# Altium integrated library Samtec 2 mm Pitch Terminal Strips.IntLib: 623 symbols (part 1 of 5) (continued)
## MMT-104-01-F-DH-004
designator P?
Horizontal Surface Mount Header, -55 to 125 degC, 2 mm Pitch, 8-Pin, Male, RoHS; Manufacturer: Samtec; PartNumber: MMT-104-01-F-DH-004; Pitch: 2 mm; DatasheetVersion: F-214; PackageVersion: CY, 12/2000; PackageReference: MMT-104-01-X-DH-004; PackageDescription: 2mm Horizontal Terminal Surface Mount Strip ASSEM; Orientation: Horizontal; RoHS: True; Temperature Range: -55 to 125 degC; Mounting Technology: Surface Mount; ComponentLink1Description: Manufacturer URL; ComponentLink1URL: http://www.samtec.com; ComponentLink2Description: Datasheet; ComponentLink2URL: http://d2a072wq521u33.cloudfront.net/catalog_english//MMT_SM.PDF; ComponentLink3Description: Package Specification; ComponentLink3URL: http://www.samtec.com/documents/webfiles/cpdf/MMT-1XX-XX-XX-XX-XX-XXX-X-XX-MKT.pdf
footprint SMTC-MMT-104-01-X-DH-004 (Terminal Surface Mount Strip ASSEM, 2x4 Pins, Horizontal, 2mm Pitch, Male)
pins: 1, 2, 3, 4, 5, 6, 7, 8

## MMT-104-01-F-DH-A
designator P?
Horizontal Surface Mount Header, -55 to 125 degC, 2 mm Pitch, 8-Pin, Male, RoHS; Manufacturer: Samtec; PartNumber: MMT-104-01-F-DH-A; Pitch: 2 mm; DatasheetVersion: F-214; PackageVersion: CY, 12/2000; PackageReference: MMT-104-01-X-DH-A; PackageDescription: 2mm Horizontal Terminal Surface Mount Strip ASSEM; Orientation: Horizontal; RoHS: True; Temperature Range: -55 to 125 degC; Mounting Technology: Surface Mount; ComponentLink1Description: Manufacturer URL; ComponentLink1URL: http://www.samtec.com; ComponentLink2Description: Datasheet; ComponentLink2URL: http://d2a072wq521u33.cloudfront.net/catalog_english//MMT_SM.PDF; ComponentLink3Description: Package Specification; ComponentLink3URL: http://www.samtec.com/documents/webfiles/cpdf/MMT-1XX-XX-XX-XX-XX-XXX-X-XX-MKT.pdf
footprint SMTC-MMT-104-01-X-DH-A (Terminal Surface Mount Strip ASSEM, 2x4 Pins, Horizontal, 2mm Pitch, Male)
pins: 1, 2, 3, 4, 5, 6, 7, 8

## MMT-104-01-F-SH
designator P?
Horizontal Surface Mount Header, -55 to 125 degC, 2 mm Pitch, 4-Pin, Male, RoHS; Manufacturer: Samtec; PartNumber: MMT-104-01-F-SH; Pitch: 2 mm; DatasheetVersion: F-214; PackageVersion: CY, 12/2000; PackageReference: MMT-104-01-X-SH; PackageDescription: 2mm Horizontal Terminal Surface Mount Strip ASSEM; Orientation: Horizontal; RoHS: True; Temperature Range: -55 to 125 degC; Mounting Technology: Surface Mount; ComponentLink1Description: Manufacturer URL; ComponentLink1URL: http://www.samtec.com; ComponentLink2Description: Datasheet; ComponentLink2URL: http://d2a072wq521u33.cloudfront.net/catalog_english//MMT_SM.PDF; ComponentLink3Description: Package Specification; ComponentLink3URL: http://www.samtec.com/documents/webfiles/cpdf/MMT-1XX-XX-XX-XX-XX-XXX-X-XX-MKT.pdf
footprint SMTC-MMT-104-01-X-SH (Terminal Surface Mount Strip ASSEM, 1x4 Pins, Horizontal, 2mm Pitch, Male)
pins: 1, 2, 3, 4

## MMT-104-01-L-DH
designator P?
Horizontal Surface Mount Header, -55 to 125 degC, 2 mm Pitch, 8-Pin, Male, RoHS; Manufacturer: Samtec; PartNumber: MMT-104-01-L-DH; Pitch: 2 mm; DatasheetVersion: F-214; PackageVersion: CY, 12/2000; PackageReference: MMT-104-01-X-DH; PackageDescription: 2mm Horizontal Terminal Surface Mount Strip ASSEM; Supplier 1: Newark; Supplier Part Number 1: 85T5657; Orientation: Horizontal; RoHS: True; Temperature Range: -55 to 125 degC; Mounting Technology: Surface Mount; ComponentLink1Description: Manufacturer URL; ComponentLink1URL: http://www.samtec.com; ComponentLink2Description: Datasheet; ComponentLink2URL: http://d2a072wq521u33.cloudfront.net/catalog_english//MMT_SM.PDF; ComponentLink3Description: Package Specification; ComponentLink3URL: http://www.samtec.com/documents/webfiles/cpdf/MMT-1XX-XX-XX-XX-XX-XXX-X-XX-MKT.pdf
footprint SMTC-MMT-104-01-X-DH (Terminal Surface Mount Strip ASSEM, 2x4 Pins, Horizontal, 2mm Pitch, Male)
pins: 1, 2, 3, 4, 5, 6, 7, 8

## MMT-104-01-L-DH-004
designator P?
Horizontal Surface Mount Header, -55 to 125 degC, 2 mm Pitch, 8-Pin, Male, RoHS; Manufacturer: Samtec; PartNumber: MMT-104-01-L-DH-004; Pitch: 2 mm; DatasheetVersion: F-214; PackageVersion: CY, 12/2000; PackageReference: MMT-104-01-X-DH-004; PackageDescription: 2mm Horizontal Terminal Surface Mount Strip ASSEM; Orientation: Horizontal; RoHS: True; Temperature Range: -55 to 125 degC; Mounting Technology: Surface Mount; ComponentLink1Description: Manufacturer URL; ComponentLink1URL: http://www.samtec.com; ComponentLink2Description: Datasheet; ComponentLink2URL: http://d2a072wq521u33.cloudfront.net/catalog_english//MMT_SM.PDF; ComponentLink3Description: Package Specification; ComponentLink3URL: http://www.samtec.com/documents/webfiles/cpdf/MMT-1XX-XX-XX-XX-XX-XXX-X-XX-MKT.pdf
footprint SMTC-MMT-104-01-X-DH-004 (Terminal Surface Mount Strip ASSEM, 2x4 Pins, Horizontal, 2mm Pitch, Male)
pins: 1, 2, 3, 4, 5, 6, 7, 8

## MMT-104-01-L-DH-A
designator P?
Horizontal Surface Mount Header, -55 to 125 degC, 2 mm Pitch, 8-Pin, Male, RoHS; Manufacturer: Samtec; PartNumber: MMT-104-01-L-DH-A; Pitch: 2 mm; DatasheetVersion: F-214; PackageVersion: CY, 12/2000; PackageReference: MMT-104-01-X-DH-A; PackageDescription: 2mm Horizontal Terminal Surface Mount Strip ASSEM; Orientation: Horizontal; RoHS: True; Temperature Range: -55 to 125 degC; Mounting Technology: Surface Mount; ComponentLink1Description: Manufacturer URL; ComponentLink1URL: http://www.samtec.com; ComponentLink2Description: Datasheet; ComponentLink2URL: http://d2a072wq521u33.cloudfront.net/catalog_english//MMT_SM.PDF; ComponentLink3Description: Package Specification; ComponentLink3URL: http://www.samtec.com/documents/webfiles/cpdf/MMT-1XX-XX-XX-XX-XX-XXX-X-XX-MKT.pdf
footprint SMTC-MMT-104-01-X-DH-A (Terminal Surface Mount Strip ASSEM, 2x4 Pins, Horizontal, 2mm Pitch, Male)
pins: 1, 2, 3, 4, 5, 6, 7, 8

## MMT-104-01-L-SH
designator P?
Horizontal Surface Mount Header, -55 to 125 degC, 2 mm Pitch, 4-Pin, Male, RoHS; Manufacturer: Samtec; PartNumber: MMT-104-01-L-SH; Pitch: 2 mm; DatasheetVersion: F-214; PackageVersion: CY, 12/2000; PackageReference: MMT-104-01-X-SH; PackageDescription: 2mm Horizontal Terminal Surface Mount Strip ASSEM; Supplier 1: Newark; Supplier Part Number 1: 85T5659; Orientation: Horizontal; RoHS: True; Temperature Range: -55 to 125 degC; Mounting Technology: Surface Mount; ComponentLink1Description: Manufacturer URL; ComponentLink1URL: http://www.samtec.com; ComponentLink2Description: Datasheet; ComponentLink2URL: http://d2a072wq521u33.cloudfront.net/catalog_english//MMT_SM.PDF; ComponentLink3Description: Package Specification; ComponentLink3URL: http://www.samtec.com/documents/webfiles/cpdf/MMT-1XX-XX-XX-XX-XX-XXX-X-XX-MKT.pdf
footprint SMTC-MMT-104-01-X-SH (Terminal Surface Mount Strip ASSEM, 1x4 Pins, Horizontal, 2mm Pitch, Male)
pins: 1, 2, 3, 4

## MMT-104-01-T-DH
designator P?
Horizontal Surface Mount Header, -55 to 105 degC, 2 mm Pitch, 8-Pin, Male, RoHS; Manufacturer: Samtec; PartNumber: MMT-104-01-T-DH; Pitch: 2 mm; DatasheetVersion: F-214; PackageVersion: CY, 12/2000; PackageReference: MMT-104-01-X-DH; PackageDescription: 2mm Horizontal Terminal Surface Mount Strip ASSEM; Supplier 1: Newark; Supplier Part Number 1: 85T5660; Orientation: Horizontal; RoHS: True; Temperature Range: -55 to 105 degC; Mounting Technology: Surface Mount; ComponentLink1Description: Manufacturer URL; ComponentLink1URL: http://www.samtec.com; ComponentLink2Description: Datasheet; ComponentLink2URL: http://d2a072wq521u33.cloudfront.net/catalog_english//MMT_SM.PDF; ComponentLink3Description: Package Specification; ComponentLink3URL: http://www.samtec.com/documents/webfiles/cpdf/MMT-1XX-XX-XX-XX-XX-XXX-X-XX-MKT.pdf
footprint SMTC-MMT-104-01-X-DH (Terminal Surface Mount Strip ASSEM, 2x4 Pins, Horizontal, 2mm Pitch, Male)
pins: 1, 2, 3, 4, 5, 6, 7, 8

## MMT-104-01-T-DH-004
designator P?
Horizontal Surface Mount Header, -55 to 105 degC, 2 mm Pitch, 8-Pin, Male, RoHS; Manufacturer: Samtec; PartNumber: MMT-104-01-T-DH-004; Pitch: 2 mm; DatasheetVersion: F-214; PackageVersion: CY, 12/2000; PackageReference: MMT-104-01-X-DH-004; PackageDescription: 2mm Horizontal Terminal Surface Mount Strip ASSEM; Orientation: Horizontal; RoHS: True; Temperature Range: -55 to 105 degC; Mounting Technology: Surface Mount; ComponentLink1Description: Manufacturer URL; ComponentLink1URL: http://www.samtec.com; ComponentLink2Description: Datasheet; ComponentLink2URL: http://d2a072wq521u33.cloudfront.net/catalog_english//MMT_SM.PDF; ComponentLink3Description: Package Specification; ComponentLink3URL: http://www.samtec.com/documents/webfiles/cpdf/MMT-1XX-XX-XX-XX-XX-XXX-X-XX-MKT.pdf
footprint SMTC-MMT-104-01-X-DH-004 (Terminal Surface Mount Strip ASSEM, 2x4 Pins, Horizontal, 2mm Pitch, Male)
pins: 1, 2, 3, 4, 5, 6, 7, 8

## MMT-104-01-T-DH-A
designator P?
Horizontal Surface Mount Header, -55 to 105 degC, 2 mm Pitch, 8-Pin, Male, RoHS; Manufacturer: Samtec; PartNumber: MMT-104-01-T-DH-A; Pitch: 2 mm; DatasheetVersion: F-214; PackageVersion: CY, 12/2000; PackageReference: MMT-104-01-X-DH-A; PackageDescription: 2mm Horizontal Terminal Surface Mount Strip ASSEM; Orientation: Horizontal; RoHS: True; Temperature Range: -55 to 105 degC; Mounting Technology: Surface Mount; ComponentLink1Description: Manufacturer URL; ComponentLink1URL: http://www.samtec.com; ComponentLink2Description: Datasheet; ComponentLink2URL: http://d2a072wq521u33.cloudfront.net/catalog_english//MMT_SM.PDF; ComponentLink3Description: Package Specification; ComponentLink3URL: http://www.samtec.com/documents/webfiles/cpdf/MMT-1XX-XX-XX-XX-XX-XXX-X-XX-MKT.pdf
footprint SMTC-MMT-104-01-X-DH-A (Terminal Surface Mount Strip ASSEM, 2x4 Pins, Horizontal, 2mm Pitch, Male)
pins: 1, 2, 3, 4, 5, 6, 7, 8

## MMT-104-01-T-SH
designator P?
Horizontal Surface Mount Header, -55 to 105 degC, 2 mm Pitch, 4-Pin, Male, RoHS; Manufacturer: Samtec; PartNumber: MMT-104-01-T-SH; Pitch: 2 mm; DatasheetVersion: F-214; PackageVersion: CY, 12/2000; PackageReference: MMT-104-01-X-SH; PackageDescription: 2mm Horizontal Terminal Surface Mount Strip ASSEM; Supplier 1: Digi-Key; Supplier Part Number 1: MMT-104-01-T-SH-ND; Supplier 2: Newark; Supplier Part Number 2: 85T5662; Orientation: Horizontal; RoHS: True; Temperature Range: -55 to 105 degC; Mounting Technology: Surface Mount; ComponentLink1Description: Manufacturer URL; ComponentLink1URL: http://www.samtec.com; ComponentLink2Description: Datasheet; ComponentLink2URL: http://d2a072wq521u33.cloudfront.net/catalog_english//MMT_SM.PDF; ComponentLink3Description: Package Specification; ComponentLink3URL: http://www.samtec.com/documents/webfiles/cpdf/MMT-1XX-XX-XX-XX-XX-XXX-X-XX-MKT.pdf
footprint SMTC-MMT-104-01-X-SH (Terminal Surface Mount Strip ASSEM, 1x4 Pins, Horizontal, 2mm Pitch, Male)
pins: 1, 2, 3, 4

## MMT-104-02-F-DH
designator P?
Horizontal Surface Mount Header, -55 to 125 degC, 2 mm Pitch, 8-Pin, Male, RoHS; Manufacturer: Samtec; PartNumber: MMT-104-02-F-DH; Pitch: 2 mm; DatasheetVersion: F-214; PackageVersion: CY, 12/2000; PackageReference: MMT-104-02-X-DH; PackageDescription: 2mm Horizontal Terminal Surface Mount Strip ASSEM; Orientation: Horizontal; RoHS: True; Temperature Range: -55 to 125 degC; Mounting Technology: Surface Mount; ComponentLink1Description: Manufacturer URL; ComponentLink1URL: http://www.samtec.com; ComponentLink2Description: Datasheet; ComponentLink2URL: http://d2a072wq521u33.cloudfront.net/catalog_english//MMT_SM.PDF; ComponentLink3Description: Package Specification; ComponentLink3URL: http://www.samtec.com/documents/webfiles/cpdf/MMT-1XX-XX-XX-XX-XX-XXX-X-XX-MKT.pdf
footprint SMTC-MMT-104-02-X-DH (Terminal Surface Mount Strip ASSEM, 2x4 Pins, Horizontal, 2mm Pitch, Male)
pins: 1, 2, 3, 4, 5, 6, 7, 8

## MMT-104-02-F-MT-P
designator P?
Header, Horizontal, -55 to 125 degC, 2 mm Pitch, 8-Pin, Male, RoHS; Manufacturer: Samtec; PartNumber: MMT-104-02-F-MT-P; Pitch: 2 mm; DatasheetVersion: F-214; PackageVersion: CY, 12/2000; PackageReference: MMT-104-02-X-MT-P; PackageDescription: 2mm Horizontal Terminal Surface Mount Strip ASSEM; Orientation: Horizontal; RoHS: True; Temperature Range: -55 to 125 degC; ComponentLink1Description: Manufacturer URL; ComponentLink1URL: http://www.samtec.com; ComponentLink2Description: Datasheet; ComponentLink2URL: http://d2a072wq521u33.cloudfront.net/catalog_english//MMT_SM.PDF; ComponentLink3Description: Package Specification; ComponentLink3URL: http://www.samtec.com/documents/webfiles/cpdf/MMT-1XX-XX-XX-XX-XX-XXX-X-XX-MKT.pdf
footprint SMTC-MMT-104-02-X-MT-P (Terminal Strip ASSEM, 2x4 Pins, Horizontal, 2mm Pitch, Male)
pins: 1, 2, 3, 4, 5, 6, 7, 8

## MMT-104-02-F-SH
designator P?
Horizontal Surface Mount Header, -55 to 125 degC, 2 mm Pitch, 4-Pin, Male, RoHS; Manufacturer: Samtec; PartNumber: MMT-104-02-F-SH; Pitch: 2 mm; DatasheetVersion: F-214; PackageVersion: CY, 12/2000; PackageReference: MMT-104-02-X-SH; PackageDescription: 2mm Horizontal Terminal Surface Mount Strip ASSEM; Orientation: Horizontal; RoHS: True; Temperature Range: -55 to 125 degC; Mounting Technology: Surface Mount; ComponentLink1Description: Manufacturer URL; ComponentLink1URL: http://www.samtec.com; ComponentLink2Description: Datasheet; ComponentLink2URL: http://d2a072wq521u33.cloudfront.net/catalog_english//MMT_SM.PDF; ComponentLink3Description: Package Specification; ComponentLink3URL: http://www.samtec.com/documents/webfiles/cpdf/MMT-1XX-XX-XX-XX-XX-XXX-X-XX-MKT.pdf
footprint SMTC-MMT-104-02-X-SH (Terminal Surface Mount Strip ASSEM, 1x4 Pins, Horizontal, 2mm Pitch, Male)
pins: 1, 2, 3, 4

## MMT-104-02-F-SH-P
designator P?
Horizontal Surface Mount Header, -55 to 125 degC, 2 mm Pitch, 4-Pin, Male, RoHS; Manufacturer: Samtec; PartNumber: MMT-104-02-F-SH-P; Pitch: 2 mm; DatasheetVersion: F-214; PackageVersion: CY, 12/2000; PackageReference: MMT-104-02-X-SH-P; PackageDescription: 2mm Horizontal Terminal Surface Mount Strip ASSEM; Orientation: Horizontal; RoHS: True; Temperature Range: -55 to 125 degC; Mounting Technology: Surface Mount; ComponentLink1Description: Manufacturer URL; ComponentLink1URL: http://www.samtec.com; ComponentLink2Description: Datasheet; ComponentLink2URL: http://d2a072wq521u33.cloudfront.net/catalog_english//MMT_SM.PDF; ComponentLink3Description: Package Specification; ComponentLink3URL: http://www.samtec.com/documents/webfiles/cpdf/MMT-1XX-XX-XX-XX-XX-XXX-X-XX-MKT.pdf
footprint SMTC-MMT-104-02-X-SH-P (Terminal Surface Mount Strip ASSEM, 1x4 Pins, Horizontal, 2mm Pitch, Male)
pins: 1, 2, 3, 4

## MMT-104-02-L-DH
designator P?
Horizontal Surface Mount Header, -55 to 125 degC, 2 mm Pitch, 8-Pin, Male, RoHS; Manufacturer: Samtec; PartNumber: MMT-104-02-L-DH; Pitch: 2 mm; DatasheetVersion: F-214; PackageVersion: CY, 12/2000; PackageReference: MMT-104-02-X-DH; PackageDescription: 2mm Horizontal Terminal Surface Mount Strip ASSEM; Supplier 1: Newark; Supplier Part Number 1: 85T5663; Orientation: Horizontal; RoHS: True; Temperature Range: -55 to 125 degC; Mounting Technology: Surface Mount; ComponentLink1Description: Manufacturer URL; ComponentLink1URL: http://www.samtec.com; ComponentLink2Description: Datasheet; ComponentLink2URL: http://d2a072wq521u33.cloudfront.net/catalog_english//MMT_SM.PDF; ComponentLink3Description: Package Specification; ComponentLink3URL: http://www.samtec.com/documents/webfiles/cpdf/MMT-1XX-XX-XX-XX-XX-XXX-X-XX-MKT.pdf
footprint SMTC-MMT-104-02-X-DH (Terminal Surface Mount Strip ASSEM, 2x4 Pins, Horizontal, 2mm Pitch, Male)
pins: 1, 2, 3, 4, 5, 6, 7, 8

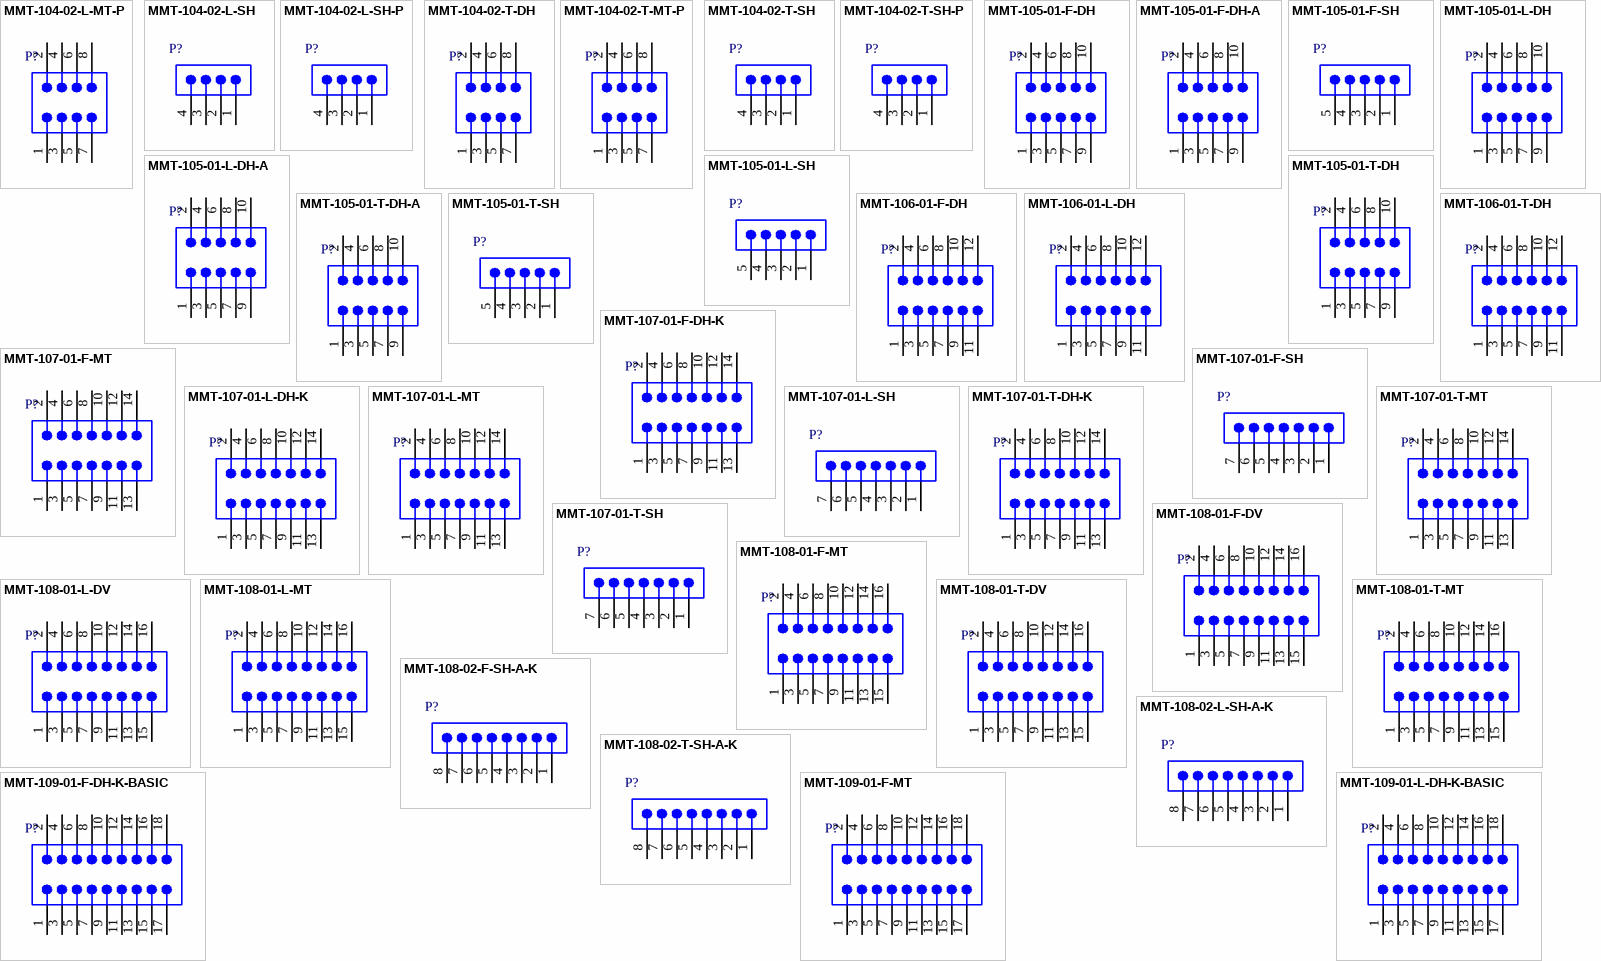
[diagram p2: symbols MMT-104-02-L-MT-P to MMT-109-01-L-DH-K-BASIC]

## MMT-104-02-L-MT-P
designator P?
Header, Horizontal, -55 to 125 degC, 2 mm Pitch, 8-Pin, Male, RoHS; Manufacturer: Samtec; PartNumber: MMT-104-02-L-MT-P; Pitch: 2 mm; DatasheetVersion: F-214; PackageVersion: CY, 12/2000; PackageReference: MMT-104-02-X-MT-P; PackageDescription: 2mm Horizontal Terminal Surface Mount Strip ASSEM; Orientation: Horizontal; RoHS: True; Temperature Range: -55 to 125 degC; ComponentLink1Description: Manufacturer URL; ComponentLink1URL: http://www.samtec.com; ComponentLink2Description: Datasheet; ComponentLink2URL: http://d2a072wq521u33.cloudfront.net/catalog_english//MMT_SM.PDF; ComponentLink3Description: Package Specification; ComponentLink3URL: http://www.samtec.com/documents/webfiles/cpdf/MMT-1XX-XX-XX-XX-XX-XXX-X-XX-MKT.pdf
footprint SMTC-MMT-104-02-X-MT-P (Terminal Strip ASSEM, 2x4 Pins, Horizontal, 2mm Pitch, Male)
pins: 1, 2, 3, 4, 5, 6, 7, 8

## MMT-104-02-L-SH
designator P?
Horizontal Surface Mount Header, -55 to 125 degC, 2 mm Pitch, 4-Pin, Male, RoHS; Manufacturer: Samtec; PartNumber: MMT-104-02-L-SH; Pitch: 2 mm; DatasheetVersion: F-214; PackageVersion: CY, 12/2000; PackageReference: MMT-104-02-X-SH; PackageDescription: 2mm Horizontal Terminal Surface Mount Strip ASSEM; Supplier 1: Newark; Supplier Part Number 1: 85T5665; Orientation: Horizontal; RoHS: True; Temperature Range: -55 to 125 degC; Mounting Technology: Surface Mount; ComponentLink1Description: Manufacturer URL; ComponentLink1URL: http://www.samtec.com; ComponentLink2Description: Datasheet; ComponentLink2URL: http://d2a072wq521u33.cloudfront.net/catalog_english//MMT_SM.PDF; ComponentLink3Description: Package Specification; ComponentLink3URL: http://www.samtec.com/documents/webfiles/cpdf/MMT-1XX-XX-XX-XX-XX-XXX-X-XX-MKT.pdf
footprint SMTC-MMT-104-02-X-SH (Terminal Surface Mount Strip ASSEM, 1x4 Pins, Horizontal, 2mm Pitch, Male)
pins: 1, 2, 3, 4

## MMT-104-02-L-SH-P
designator P?
Horizontal Surface Mount Header, -55 to 125 degC, 2 mm Pitch, 4-Pin, Male, RoHS; Manufacturer: Samtec; PartNumber: MMT-104-02-L-SH-P; Pitch: 2 mm; DatasheetVersion: F-214; PackageVersion: CY, 12/2000; PackageReference: MMT-104-02-X-SH-P; PackageDescription: 2mm Horizontal Terminal Surface Mount Strip ASSEM; Orientation: Horizontal; RoHS: True; Temperature Range: -55 to 125 degC; Mounting Technology: Surface Mount; ComponentLink1Description: Manufacturer URL; ComponentLink1URL: http://www.samtec.com; ComponentLink2Description: Datasheet; ComponentLink2URL: http://d2a072wq521u33.cloudfront.net/catalog_english//MMT_SM.PDF; ComponentLink3Description: Package Specification; ComponentLink3URL: http://www.samtec.com/documents/webfiles/cpdf/MMT-1XX-XX-XX-XX-XX-XXX-X-XX-MKT.pdf
footprint SMTC-MMT-104-02-X-SH-P (Terminal Surface Mount Strip ASSEM, 1x4 Pins, Horizontal, 2mm Pitch, Male)
pins: 1, 2, 3, 4

## MMT-104-02-T-DH
designator P?
Horizontal Surface Mount Header, -55 to 105 degC, 2 mm Pitch, 8-Pin, Male, RoHS; Manufacturer: Samtec; PartNumber: MMT-104-02-T-DH; Pitch: 2 mm; DatasheetVersion: F-214; PackageVersion: CY, 12/2000; PackageReference: MMT-104-02-X-DH; PackageDescription: 2mm Horizontal Terminal Surface Mount Strip ASSEM; Supplier 1: Newark; Supplier Part Number 1: 85T5666; Orientation: Horizontal; RoHS: True; Temperature Range: -55 to 105 degC; Mounting Technology: Surface Mount; ComponentLink1Description: Manufacturer URL; ComponentLink1URL: http://www.samtec.com; ComponentLink2Description: Datasheet; ComponentLink2URL: http://d2a072wq521u33.cloudfront.net/catalog_english//MMT_SM.PDF; ComponentLink3Description: Package Specification; ComponentLink3URL: http://www.samtec.com/documents/webfiles/cpdf/MMT-1XX-XX-XX-XX-XX-XXX-X-XX-MKT.pdf
footprint SMTC-MMT-104-02-X-DH (Terminal Surface Mount Strip ASSEM, 2x4 Pins, Horizontal, 2mm Pitch, Male)
pins: 1, 2, 3, 4, 5, 6, 7, 8

## MMT-104-02-T-MT-P
designator P?
Header, Horizontal, -55 to 105 degC, 2 mm Pitch, 8-Pin, Male, RoHS; Manufacturer: Samtec; PartNumber: MMT-104-02-T-MT-P; Pitch: 2 mm; DatasheetVersion: F-214; PackageVersion: CY, 12/2000; PackageReference: MMT-104-02-X-MT-P; PackageDescription: 2mm Horizontal Terminal Surface Mount Strip ASSEM; Orientation: Horizontal; RoHS: True; Temperature Range: -55 to 105 degC; ComponentLink1Description: Manufacturer URL; ComponentLink1URL: http://www.samtec.com; ComponentLink2Description: Datasheet; ComponentLink2URL: http://d2a072wq521u33.cloudfront.net/catalog_english//MMT_SM.PDF; ComponentLink3Description: Package Specification; ComponentLink3URL: http://www.samtec.com/documents/webfiles/cpdf/MMT-1XX-XX-XX-XX-XX-XXX-X-XX-MKT.pdf
footprint SMTC-MMT-104-02-X-MT-P (Terminal Strip ASSEM, 2x4 Pins, Horizontal, 2mm Pitch, Male)
pins: 1, 2, 3, 4, 5, 6, 7, 8

## MMT-104-02-T-SH
designator P?
Horizontal Surface Mount Header, -55 to 105 degC, 2 mm Pitch, 4-Pin, Male, RoHS; Manufacturer: Samtec; PartNumber: MMT-104-02-T-SH; Pitch: 2 mm; DatasheetVersion: F-214; PackageVersion: CY, 12/2000; PackageReference: MMT-104-02-X-SH; PackageDescription: 2mm Horizontal Terminal Surface Mount Strip ASSEM; Supplier 1: Digi-Key; Supplier Part Number 1: MMT-104-02-T-SH-ND; Supplier 2: Newark; Supplier Part Number 2: 85T5668; Orientation: Horizontal; RoHS: True; Temperature Range: -55 to 105 degC; Mounting Technology: Surface Mount; ComponentLink1Description: Manufacturer URL; ComponentLink1URL: http://www.samtec.com; ComponentLink2Description: Datasheet; ComponentLink2URL: http://d2a072wq521u33.cloudfront.net/catalog_english//MMT_SM.PDF; ComponentLink3Description: Package Specification; ComponentLink3URL: http://www.samtec.com/documents/webfiles/cpdf/MMT-1XX-XX-XX-XX-XX-XXX-X-XX-MKT.pdf
footprint SMTC-MMT-104-02-X-SH (Terminal Surface Mount Strip ASSEM, 1x4 Pins, Horizontal, 2mm Pitch, Male)
pins: 1, 2, 3, 4

## MMT-104-02-T-SH-P
designator P?
Horizontal Surface Mount Header, -55 to 105 degC, 2 mm Pitch, 4-Pin, Male, RoHS; Manufacturer: Samtec; PartNumber: MMT-104-02-T-SH-P; Pitch: 2 mm; DatasheetVersion: F-214; PackageVersion: CY, 12/2000; PackageReference: MMT-104-02-X-SH-P; PackageDescription: 2mm Horizontal Terminal Surface Mount Strip ASSEM; Orientation: Horizontal; RoHS: True; Temperature Range: -55 to 105 degC; Mounting Technology: Surface Mount; ComponentLink1Description: Manufacturer URL; ComponentLink1URL: http://www.samtec.com; ComponentLink2Description: Datasheet; ComponentLink2URL: http://d2a072wq521u33.cloudfront.net/catalog_english//MMT_SM.PDF; ComponentLink3Description: Package Specification; ComponentLink3URL: http://www.samtec.com/documents/webfiles/cpdf/MMT-1XX-XX-XX-XX-XX-XXX-X-XX-MKT.pdf
footprint SMTC-MMT-104-02-X-SH-P (Terminal Surface Mount Strip ASSEM, 1x4 Pins, Horizontal, 2mm Pitch, Male)
pins: 1, 2, 3, 4

## MMT-105-01-F-DH
designator P?
Horizontal Surface Mount Header, -55 to 125 degC, 2 mm Pitch, 10-Pin, Male, RoHS; Manufacturer: Samtec; PartNumber: MMT-105-01-F-DH; Pitch: 2 mm; DatasheetVersion: F-214; PackageVersion: CY, 12/2000; PackageReference: MMT-105-01-X-DH; PackageDescription: 2mm Horizontal Terminal Surface Mount Strip ASSEM; Orientation: Horizontal; RoHS: True; Temperature Range: -55 to 125 degC; Mounting Technology: Surface Mount; ComponentLink1Description: Manufacturer URL; ComponentLink1URL: http://www.samtec.com; ComponentLink2Description: Datasheet; ComponentLink2URL: http://d2a072wq521u33.cloudfront.net/catalog_english//MMT_SM.PDF; ComponentLink3Description: Package Specification; ComponentLink3URL: http://www.samtec.com/documents/webfiles/cpdf/MMT-1XX-XX-XX-XX-XX-XXX-X-XX-MKT.pdf
footprint SMTC-MMT-105-01-X-DH (Terminal Surface Mount Strip ASSEM, 2x5 Pins, Horizontal, 2mm Pitch, Male)
pins: 1, 2, 3, 4, 5, 6, 7, 8, 9, 10

## MMT-105-01-F-DH-A
designator P?
Horizontal Surface Mount Header, -55 to 125 degC, 2 mm Pitch, 10-Pin, Male, RoHS; Manufacturer: Samtec; PartNumber: MMT-105-01-F-DH-A; Pitch: 2 mm; DatasheetVersion: F-214; PackageVersion: CY, 12/2000; PackageReference: MMT-105-01-X-DH-A; PackageDescription: 2mm Horizontal Terminal Surface Mount Strip ASSEM; Orientation: Horizontal; RoHS: True; Temperature Range: -55 to 125 degC; Mounting Technology: Surface Mount; ComponentLink1Description: Manufacturer URL; ComponentLink1URL: http://www.samtec.com; ComponentLink2Description: Datasheet; ComponentLink2URL: http://d2a072wq521u33.cloudfront.net/catalog_english//MMT_SM.PDF; ComponentLink3Description: Package Specification; ComponentLink3URL: http://www.samtec.com/documents/webfiles/cpdf/MMT-1XX-XX-XX-XX-XX-XXX-X-XX-MKT.pdf
footprint SMTC-MMT-105-01-X-DH-A (Terminal Surface Mount Strip ASSEM, 2x5 Pins, Horizontal, 2mm Pitch, Male)
pins: 1, 2, 3, 4, 5, 6, 7, 8, 9, 10

## MMT-105-01-F-SH
designator P?
Horizontal Surface Mount Header, -55 to 125 degC, 2 mm Pitch, 5-Pin, Male, RoHS; Manufacturer: Samtec; PartNumber: MMT-105-01-F-SH; Pitch: 2 mm; DatasheetVersion: F-214; PackageVersion: CY, 12/2000; PackageReference: MMT-105-01-X-SH; PackageDescription: 2mm Horizontal Terminal Surface Mount Strip ASSEM; Orientation: Horizontal; RoHS: True; Temperature Range: -55 to 125 degC; Mounting Technology: Surface Mount; ComponentLink1Description: Manufacturer URL; ComponentLink1URL: http://www.samtec.com; ComponentLink2Description: Datasheet; ComponentLink2URL: http://d2a072wq521u33.cloudfront.net/catalog_english//MMT_SM.PDF; ComponentLink3Description: Package Specification; ComponentLink3URL: http://www.samtec.com/documents/webfiles/cpdf/MMT-1XX-XX-XX-XX-XX-XXX-X-XX-MKT.pdf
footprint SMTC-MMT-105-01-X-SH (Terminal Surface Mount Strip ASSEM, 1x5 Pins, Horizontal, 2mm Pitch, Male)
pins: 1, 2, 3, 4, 5

## MMT-105-01-L-DH
designator P?
Horizontal Surface Mount Header, -55 to 125 degC, 2 mm Pitch, 10-Pin, Male, RoHS; Manufacturer: Samtec; PartNumber: MMT-105-01-L-DH; Pitch: 2 mm; DatasheetVersion: F-214; PackageVersion: CY, 12/2000; PackageReference: MMT-105-01-X-DH; PackageDescription: 2mm Horizontal Terminal Surface Mount Strip ASSEM; Supplier 1: Newark; Supplier Part Number 1: 85T5669; Orientation: Horizontal; RoHS: True; Temperature Range: -55 to 125 degC; Mounting Technology: Surface Mount; ComponentLink1Description: Manufacturer URL; ComponentLink1URL: http://www.samtec.com; ComponentLink2Description: Datasheet; ComponentLink2URL: http://d2a072wq521u33.cloudfront.net/catalog_english//MMT_SM.PDF; ComponentLink3Description: Package Specification; ComponentLink3URL: http://www.samtec.com/documents/webfiles/cpdf/MMT-1XX-XX-XX-XX-XX-XXX-X-XX-MKT.pdf
footprint SMTC-MMT-105-01-X-DH (Terminal Surface Mount Strip ASSEM, 2x5 Pins, Horizontal, 2mm Pitch, Male)
pins: 1, 2, 3, 4, 5, 6, 7, 8, 9, 10

## MMT-105-01-L-DH-A
designator P?
Horizontal Surface Mount Header, -55 to 125 degC, 2 mm Pitch, 10-Pin, Male, RoHS; Manufacturer: Samtec; PartNumber: MMT-105-01-L-DH-A; Pitch: 2 mm; DatasheetVersion: F-214; PackageVersion: CY, 12/2000; PackageReference: MMT-105-01-X-DH-A; PackageDescription: 2mm Horizontal Terminal Surface Mount Strip ASSEM; Orientation: Horizontal; RoHS: True; Temperature Range: -55 to 125 degC; Mounting Technology: Surface Mount; ComponentLink1Description: Manufacturer URL; ComponentLink1URL: http://www.samtec.com; ComponentLink2Description: Datasheet; ComponentLink2URL: http://d2a072wq521u33.cloudfront.net/catalog_english//MMT_SM.PDF; ComponentLink3Description: Package Specification; ComponentLink3URL: http://www.samtec.com/documents/webfiles/cpdf/MMT-1XX-XX-XX-XX-XX-XXX-X-XX-MKT.pdf
footprint SMTC-MMT-105-01-X-DH-A (Terminal Surface Mount Strip ASSEM, 2x5 Pins, Horizontal, 2mm Pitch, Male)
pins: 1, 2, 3, 4, 5, 6, 7, 8, 9, 10

## MMT-105-01-L-SH
designator P?
Horizontal Surface Mount Header, -55 to 125 degC, 2 mm Pitch, 5-Pin, Male, RoHS; Manufacturer: Samtec; PartNumber: MMT-105-01-L-SH; Pitch: 2 mm; DatasheetVersion: F-214; PackageVersion: CY, 12/2000; PackageReference: MMT-105-01-X-SH; PackageDescription: 2mm Horizontal Terminal Surface Mount Strip ASSEM; Supplier 1: Newark; Supplier Part Number 1: 85T5672; Orientation: Horizontal; RoHS: True; Temperature Range: -55 to 125 degC; Mounting Technology: Surface Mount; ComponentLink1Description: Manufacturer URL; ComponentLink1URL: http://www.samtec.com; ComponentLink2Description: Datasheet; ComponentLink2URL: http://d2a072wq521u33.cloudfront.net/catalog_english//MMT_SM.PDF; ComponentLink3Description: Package Specification; ComponentLink3URL: http://www.samtec.com/documents/webfiles/cpdf/MMT-1XX-XX-XX-XX-XX-XXX-X-XX-MKT.pdf
footprint SMTC-MMT-105-01-X-SH (Terminal Surface Mount Strip ASSEM, 1x5 Pins, Horizontal, 2mm Pitch, Male)
pins: 1, 2, 3, 4, 5

## MMT-105-01-T-DH
designator P?
Horizontal Surface Mount Header, -55 to 105 degC, 2 mm Pitch, 10-Pin, Male, RoHS; Manufacturer: Samtec; PartNumber: MMT-105-01-T-DH; Pitch: 2 mm; DatasheetVersion: F-214; PackageVersion: CY, 12/2000; PackageReference: MMT-105-01-X-DH; PackageDescription: 2mm Horizontal Terminal Surface Mount Strip ASSEM; Supplier 1: Newark; Supplier Part Number 1: 85T5673; Orientation: Horizontal; RoHS: True; Temperature Range: -55 to 105 degC; Mounting Technology: Surface Mount; ComponentLink1Description: Manufacturer URL; ComponentLink1URL: http://www.samtec.com; ComponentLink2Description: Datasheet; ComponentLink2URL: http://d2a072wq521u33.cloudfront.net/catalog_english//MMT_SM.PDF; ComponentLink3Description: Package Specification; ComponentLink3URL: http://www.samtec.com/documents/webfiles/cpdf/MMT-1XX-XX-XX-XX-XX-XXX-X-XX-MKT.pdf
footprint SMTC-MMT-105-01-X-DH (Terminal Surface Mount Strip ASSEM, 2x5 Pins, Horizontal, 2mm Pitch, Male)
pins: 1, 2, 3, 4, 5, 6, 7, 8, 9, 10

## MMT-105-01-T-DH-A
designator P?
Horizontal Surface Mount Header, -55 to 105 degC, 2 mm Pitch, 10-Pin, Male, RoHS; Manufacturer: Samtec; PartNumber: MMT-105-01-T-DH-A; Pitch: 2 mm; DatasheetVersion: F-214; PackageVersion: CY, 12/2000; PackageReference: MMT-105-01-X-DH-A; PackageDescription: 2mm Horizontal Terminal Surface Mount Strip ASSEM; Orientation: Horizontal; RoHS: True; Temperature Range: -55 to 105 degC; Mounting Technology: Surface Mount; ComponentLink1Description: Manufacturer URL; ComponentLink1URL: http://www.samtec.com; ComponentLink2Description: Datasheet; ComponentLink2URL: http://d2a072wq521u33.cloudfront.net/catalog_english//MMT_SM.PDF; ComponentLink3Description: Package Specification; ComponentLink3URL: http://www.samtec.com/documents/webfiles/cpdf/MMT-1XX-XX-XX-XX-XX-XXX-X-XX-MKT.pdf
footprint SMTC-MMT-105-01-X-DH-A (Terminal Surface Mount Strip ASSEM, 2x5 Pins, Horizontal, 2mm Pitch, Male)
pins: 1, 2, 3, 4, 5, 6, 7, 8, 9, 10

## MMT-105-01-T-SH
designator P?
Horizontal Surface Mount Header, -55 to 105 degC, 2 mm Pitch, 5-Pin, Male, RoHS; Manufacturer: Samtec; PartNumber: MMT-105-01-T-SH; Pitch: 2 mm; DatasheetVersion: F-214; PackageVersion: CY, 12/2000; PackageReference: MMT-105-01-X-SH; PackageDescription: 2mm Horizontal Terminal Surface Mount Strip ASSEM; Supplier 1: Newark; Supplier Part Number 1: 85T5675; Orientation: Horizontal; RoHS: True; Temperature Range: -55 to 105 degC; Mounting Technology: Surface Mount; ComponentLink1Description: Manufacturer URL; ComponentLink1URL: http://www.samtec.com; ComponentLink2Description: Datasheet; ComponentLink2URL: http://d2a072wq521u33.cloudfront.net/catalog_english//MMT_SM.PDF; ComponentLink3Description: Package Specification; ComponentLink3URL: http://www.samtec.com/documents/webfiles/cpdf/MMT-1XX-XX-XX-XX-XX-XXX-X-XX-MKT.pdf
footprint SMTC-MMT-105-01-X-SH (Terminal Surface Mount Strip ASSEM, 1x5 Pins, Horizontal, 2mm Pitch, Male)
pins: 1, 2, 3, 4, 5

## MMT-106-01-F-DH
designator P?
Horizontal Surface Mount Header, -55 to 125 degC, 2 mm Pitch, 12-Pin, Male, RoHS; Manufacturer: Samtec; PartNumber: MMT-106-01-F-DH; Pitch: 2 mm; DatasheetVersion: F-214; PackageVersion: CY, 12/2000; PackageReference: MMT-106-01-X-DH; PackageDescription: 2mm Horizontal Terminal Surface Mount Strip ASSEM; Orientation: Horizontal; RoHS: True; Temperature Range: -55 to 125 degC; Mounting Technology: Surface Mount; ComponentLink1Description: Manufacturer URL; ComponentLink1URL: http://www.samtec.com; ComponentLink2Description: Datasheet; ComponentLink2URL: http://d2a072wq521u33.cloudfront.net/catalog_english//MMT_SM.PDF; ComponentLink3Description: Package Specification; ComponentLink3URL: http://www.samtec.com/documents/webfiles/cpdf/MMT-1XX-XX-XX-XX-XX-XXX-X-XX-MKT.pdf
footprint SMTC-MMT-106-01-X-DH (Terminal Surface Mount Strip ASSEM, 2x6 Pins, Horizontal, 2mm Pitch, Male)
pins: 1, 2, 3, 4, 5, 6, 7, 8, 9, 10, 11, 12

## MMT-106-01-L-DH
designator P?
Horizontal Surface Mount Header, -55 to 125 degC, 2 mm Pitch, 12-Pin, Male, RoHS; Manufacturer: Samtec; PartNumber: MMT-106-01-L-DH; Pitch: 2 mm; DatasheetVersion: F-214; PackageVersion: CY, 12/2000; PackageReference: MMT-106-01-X-DH; PackageDescription: 2mm Horizontal Terminal Surface Mount Strip ASSEM; Supplier 1: Newark; Supplier Part Number 1: 85T5682; Orientation: Horizontal; RoHS: True; Temperature Range: -55 to 125 degC; Mounting Technology: Surface Mount; ComponentLink1Description: Manufacturer URL; ComponentLink1URL: http://www.samtec.com; ComponentLink2Description: Datasheet; ComponentLink2URL: http://d2a072wq521u33.cloudfront.net/catalog_english//MMT_SM.PDF; ComponentLink3Description: Package Specification; ComponentLink3URL: http://www.samtec.com/documents/webfiles/cpdf/MMT-1XX-XX-XX-XX-XX-XXX-X-XX-MKT.pdf
footprint SMTC-MMT-106-01-X-DH (Terminal Surface Mount Strip ASSEM, 2x6 Pins, Horizontal, 2mm Pitch, Male)
pins: 1, 2, 3, 4, 5, 6, 7, 8, 9, 10, 11, 12

## MMT-106-01-T-DH
designator P?
Horizontal Surface Mount Header, -55 to 105 degC, 2 mm Pitch, 12-Pin, Male, RoHS; Manufacturer: Samtec; PartNumber: MMT-106-01-T-DH; Pitch: 2 mm; DatasheetVersion: F-214; PackageVersion: CY, 12/2000; PackageReference: MMT-106-01-X-DH; PackageDescription: 2mm Horizontal Terminal Surface Mount Strip ASSEM; Supplier 1: Newark; Supplier Part Number 1: 85T5688; Orientation: Horizontal; RoHS: True; Temperature Range: -55 to 105 degC; Mounting Technology: Surface Mount; ComponentLink1Description: Manufacturer URL; ComponentLink1URL: http://www.samtec.com; ComponentLink2Description: Datasheet; ComponentLink2URL: http://d2a072wq521u33.cloudfront.net/catalog_english//MMT_SM.PDF; ComponentLink3Description: Package Specification; ComponentLink3URL: http://www.samtec.com/documents/webfiles/cpdf/MMT-1XX-XX-XX-XX-XX-XXX-X-XX-MKT.pdf
footprint SMTC-MMT-106-01-X-DH (Terminal Surface Mount Strip ASSEM, 2x6 Pins, Horizontal, 2mm Pitch, Male)
pins: 1, 2, 3, 4, 5, 6, 7, 8, 9, 10, 11, 12

## MMT-107-01-F-DH-K
designator P?
Horizontal Surface Mount Header, -55 to 125 degC, 2 mm Pitch, 14-Pin, Male, RoHS; Manufacturer: Samtec; PartNumber: MMT-107-01-F-DH-K; Pitch: 2 mm; DatasheetVersion: F-214; PackageVersion: CY, 12/2000; PackageReference: MMT-107-01-X-DH-K; PackageDescription: 2mm Horizontal Terminal Surface Mount Strip ASSEM; Orientation: Horizontal; RoHS: True; Temperature Range: -55 to 125 degC; Mounting Technology: Surface Mount; ComponentLink1Description: Manufacturer URL; ComponentLink1URL: http://www.samtec.com; ComponentLink2Description: Datasheet; ComponentLink2URL: http://d2a072wq521u33.cloudfront.net/catalog_english//MMT_SM.PDF; ComponentLink3Description: Package Specification; ComponentLink3URL: http://www.samtec.com/documents/webfiles/cpdf/MMT-1XX-XX-XX-XX-XX-XXX-X-XX-MKT.pdf
footprint SMTC-MMT-107-01-X-DH-K (Terminal Surface Mount Strip ASSEM, 2x7 Pins, Horizontal, 2mm Pitch, Male)
pins: 1, 2, 3, 4, 5, 6, 7, 8, 9, 10, 11, 12, 13, 14

## MMT-107-01-F-MT
designator P?
Header, Horizontal, -55 to 125 degC, 2 mm Pitch, 14-Pin, Male, RoHS; Manufacturer: Samtec; PartNumber: MMT-107-01-F-MT; Pitch: 2 mm; DatasheetVersion: F-214; PackageVersion: CY, 12/2000; PackageReference: MMT-107-01-X-MT; PackageDescription: 2mm Horizontal Terminal Surface Mount Strip ASSEM; Orientation: Horizontal; RoHS: True; Temperature Range: -55 to 125 degC; ComponentLink1Description: Manufacturer URL; ComponentLink1URL: http://www.samtec.com; ComponentLink2Description: Datasheet; ComponentLink2URL: http://d2a072wq521u33.cloudfront.net/catalog_english//MMT_SM.PDF; ComponentLink3Description: Package Specification; ComponentLink3URL: http://www.samtec.com/documents/webfiles/cpdf/MMT-1XX-XX-XX-XX-XX-XXX-X-XX-MKT.pdf
footprint SMTC-MMT-107-01-X-MT (Terminal Strip ASSEM, 2x7 Pins, Horizontal, 2mm Pitch, Male)
pins: 1, 2, 3, 4, 5, 6, 7, 8, 9, 10, 11, 12, 13, 14

## MMT-107-01-F-SH
designator P?
Horizontal Surface Mount Header, -55 to 125 degC, 2 mm Pitch, 7-Pin, Male, RoHS; Manufacturer: Samtec; PartNumber: MMT-107-01-F-SH; Pitch: 2 mm; DatasheetVersion: F-214; PackageVersion: CY, 12/2000; PackageReference: MMT-107-01-X-SH; PackageDescription: 2mm Horizontal Terminal Surface Mount Strip ASSEM; Orientation: Horizontal; RoHS: True; Temperature Range: -55 to 125 degC; Mounting Technology: Surface Mount; ComponentLink1Description: Manufacturer URL; ComponentLink1URL: http://www.samtec.com; ComponentLink2Description: Datasheet; ComponentLink2URL: http://d2a072wq521u33.cloudfront.net/catalog_english//MMT_SM.PDF; ComponentLink3Description: Package Specification; ComponentLink3URL: http://www.samtec.com/documents/webfiles/cpdf/MMT-1XX-XX-XX-XX-XX-XXX-X-XX-MKT.pdf
footprint SMTC-MMT-107-01-X-SH (Terminal Surface Mount Strip ASSEM, 1x7 Pins, Horizontal, 2mm Pitch, Male)
pins: 1, 2, 3, 4, 5, 6, 7
